# Altium footprint library FOC.PcbLib: 148 footprints (part 3 of 10)
Each footprint in its own frame and in the unit in brackets; x right, y up, seen from the top. Pads: shape width x height; smd on the part's side, far side on the other; paste and mask are expansions set on the pad; w line width, h text height; cw(c..) or ccw(c..) is an arc to the next point about the centre after c.
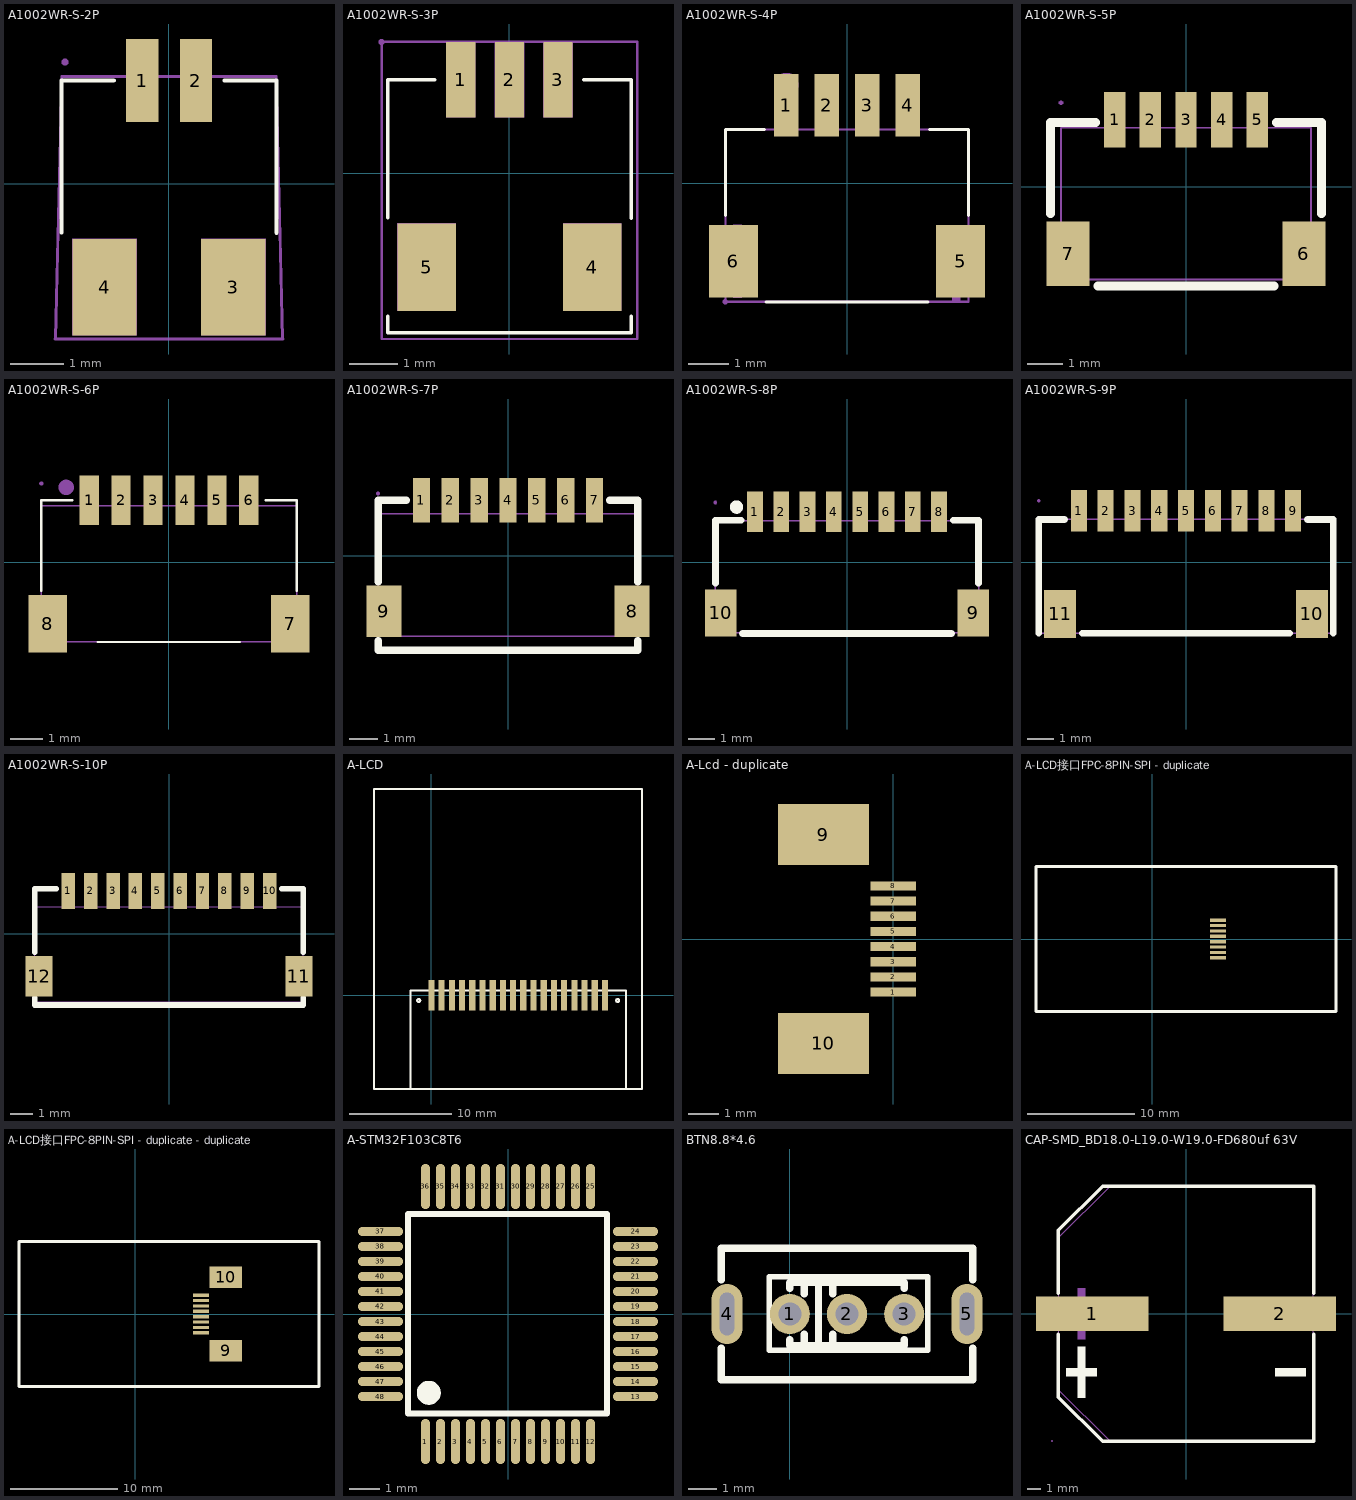
[diagram p2: the footprints below, top view; thin cyan lines are the x and y axes]

## A1002WR-S-2P [mm]
pads (4):
  rect 0.6x1.55 smd: 1(-0.498,1.924) 2(0.501,1.924)
  rect 1.2x1.8 smd: 3(1.201,-1.924) 4(-1.201,-1.924)
Top Overlay:
  lines w0.076: -2,-0.909 -2,1.923 -1.03,1.923 ; 1.033,1.923 2.001,1.923 2.001,-0.913
Mechanical 15:
  region: -1.876,2.267 -1.876,2.292 -1.911,2.327 -1.961,2.327 -1.996,2.292 -1.996,2.267 -1.996,2.243 -1.961,2.207 -1.911,2.207 -1.876,2.243
  region: 0.601,-1.025 1.8,-1.025 1.8,-2.823 0.601,-2.823
  region: -1.801,-1.025 -0.6,-1.025 -0.6,-2.823 -1.801,-2.823
  region: -0.598,2.274 -0.398,2.274 -0.398,1.574 -0.598,1.574
  region: 0.401,2.274 0.601,2.274 0.601,1.574 0.401,1.574
  lines w0.051: -2.127,-2.893 2.128,-2.893 ; -2.115,-2.893 -2,2 2,2 2.116,-2.893
3D body "A1002WR-S-2P.STEP": height 2.44, standoff -0.01, extent -1.75,-2.76 1.75,2.24

## A1002WR-S-3P [mm]
pads (5):
  rect 0.6x1.55 smd: 1(-1.003,1.926) 2(-0.001,1.924) 3(0.997,1.926)
  rect 1.2x1.8 smd: 4(1.701,-1.926) 5(-1.701,-1.926)
Top Overlay:
  lines w0.076: -2.501,-2.94 -2.501,-3.276 2.501,-3.276 2.501,-2.937 ; -2.501,-0.912 -2.501,1.922 -1.534,1.922 ; 1.528,1.922 2.501,1.922 2.501,-0.915
Mechanical 15:
  region: -2.568,2.701 -2.568,2.726 -2.603,2.761 -2.653,2.761 -2.688,2.726 -2.688,2.701 -2.688,2.676 -2.653,2.641 -2.603,2.641 -2.568,2.676
  region: 1.297,1.151 0.697,1.151 0.697,2.701 1.297,2.701
  region: -2.301,-1.027 -1.1,-1.027 -1.1,-2.825 -2.301,-2.825
  region: 1.101,-1.027 2.3,-1.027 2.3,-2.825 1.101,-2.825
  region: 0.299,1.149 -0.301,1.149 -0.301,2.699 0.299,2.699
  region: -0.703,1.151 -1.303,1.151 -1.303,2.701 -0.703,2.701
  lines w0.051: -2.628,-3.403 -2.628,2.701 2.628,2.701 2.628,-3.403 -2.628,-3.403
3D body "3.STEP": height 2.44, standoff -0.01, extent -2.242,-2.5 2.258,2.5

## A1002WR-S-4P [mm]
pads (6):
  rect 0.6x1.55 smd: 1(-1.5,1.924) 2(-0.5,1.924) 3(0.5,1.924) 4(1.5,1.924)
  rect 1.2x1.8 smd: 5(2.8,-1.924) 6(-2.8,-1.924)
Top Overlay:
  lines w0.076: -3,-0.794 -3,1.326 -2.031,1.326 ; -1.992,-2.926 1.993,-2.926 ; 2.031,1.326 2.999,1.326 2.999,-0.794
Mechanical 6:
  circle w0.3: c-1.5,2.424 r0.15
Mechanical 15:
  region: -2.94,-2.924 -2.94,-2.899 -2.976,-2.864 -3.025,-2.864 -3.06,-2.899 -3.06,-2.924 -3.06,-2.948 -3.025,-2.984 -2.976,-2.984 -2.94,-2.948
  region: -2.8,-1.024 -2.6,-1.024 -2.6,-2.824 -2.8,-2.824
  region: 2.6,-1.124 2.8,-1.124 2.8,-2.924 2.6,-2.924
  region: -1.4,1.276 -1.6,1.276 -1.6,2.026 -1.4,2.026
  region: -0.4,1.276 -0.6,1.276 -0.6,2.026 -0.4,2.026
  region: 0.6,1.276 0.4,1.276 0.4,2.026 0.6,2.026
  region: 1.6,1.276 1.4,1.276 1.4,2.026 1.6,2.026
  lines w0.051: -3,-2.924 3,-2.924 3,1.326 -3,1.326 -3,-2.924
3D body "4.STEP": height 3.19, standoff -0.01, extent -3.05,-2.661 3.051,2.559

## A1002WR-S-5P [mm]
pads (7):
  rect 0.6x1.55 smd: 1(-2,1.876) 2(-1,1.876) 3(0,1.876) 4(1,1.876) 5(2,1.876)
  rect 1.2x1.8 smd: 6(3.3,-1.876) 7(-3.3,-1.876)
Top Overlay:
  lines w0.254: -3.8,-0.746 -3.8,0.6 -3.8,1.6 -3.8,1.8 -2.531,1.8 ; -2.468,-2.78 2.469,-2.78 ; 2.531,1.8 3.8,1.8 3.8,0.6 ; 3.8,-0.75 3.8,0.733
Mechanical 15:
  region: 3.2,-1.099 3.4,-1.099 3.4,-2.599 3.2,-2.599
  region: -3.4,-1.099 -3.2,-1.099 -3.2,-2.599 -3.4,-2.599
  region: -1.9,1.401 -2.1,1.401 -2.1,2.351 -1.9,2.351
  region: -0.9,1.401 -1.1,1.401 -1.1,2.351 -0.9,2.351
  region: 0.1,1.401 -0.1,1.401 -0.1,2.351 0.1,2.351
  region: 1.1,1.401 0.9,1.401 0.9,2.351 1.1,2.351
  region: 2.1,1.401 1.9,1.401 1.9,2.351 2.1,2.351
  region: -3.44,2.351 -3.44,2.376 -3.475,2.411 -3.525,2.411 -3.56,2.376 -3.56,2.351 -3.56,2.327 -3.525,2.291 -3.475,2.291 -3.44,2.327
  lines w0.051: -3.5,-2.599 3.5,-2.599 3.5,1.651 -3.5,1.651 -3.5,-2.599
3D body "KHG.STEP": height 3.15, standoff 0.01, extent -3.5,-2.658 3.5,2.542

## A1002WR-S-6P [mm]
pads (8):
  rect 0.6x1.55 smd: 1(-2.5,1.939) 2(-1.5,1.939) 3(-0.498,1.936) 4(0.501,1.937) 5(1.502,1.937) 6(2.502,1.937)
  rect 1.2x1.8 smd: 7(3.801,-1.939) 8(-3.801,-1.937)
Top Overlay:
  lines w0.076: -3.998,-0.899 -3.998,1.935 -3.032,1.935 ; -2.238,-2.507 2.222,-2.507 ; 3.033,1.935 4.003,1.935 4.003,-0.902
Mechanical 6:
  circle w0.24: c-3.22,2.34 r0.12
Mechanical 15:
  region: 2.602,1.66 2.402,1.66 2.402,2.46 2.602,2.46
  region: 1.602,1.66 1.402,1.66 1.402,2.46 1.602,2.46
  region: 0.601,1.66 0.401,1.66 0.401,2.46 0.601,2.46
  region: -0.398,1.66 -0.598,1.66 -0.598,2.46 -0.398,2.46
  region: -1.4,1.66 -1.6,1.66 -1.6,2.46 -1.4,2.46
  region: -2.4,1.66 -2.6,1.66 -2.6,2.46 -2.4,2.46
  region: 3.701,-1.439 3.901,-1.439 3.901,-2.439 3.701,-2.439
  region: -3.901,-1.437 -3.701,-1.437 -3.701,-2.437 -3.901,-2.437
  region: -3.94,2.46 -3.94,2.485 -3.975,2.52 -4.025,2.52 -4.06,2.485 -4.06,2.46 -4.06,2.435 -4.025,2.4 -3.975,2.4 -3.94,2.435
  lines w0.051: -4,-2.5 -4,1.76 4,1.76 4,-2.5 -4,-2.5
3D body "6.STEP": height 2.44, standoff -0.01, extent -3.79,-2.76 3.71,2.24

## A1002WR-S-7P [mm]
pads (9):
  rect 0.6x1.55 smd: 1(-2.999,1.924) 2(-1.999,1.924) 3(-0.997,1.921) 4(0,1.924) 5(0.998,1.925) 6(2.001,1.924) 7(3,1.924)
  rect 1.2x1.8 smd: 8(4.3,-1.925) 9(-4.3,-1.925)
Top Overlay:
  lines w0.254: -4.5,-2.939 -4.5,-3.275 4.5,-3.275 4.5,-2.936 ; -4.5,-0.912 -4.5,1.923 -3.531,1.923 ; 3.531,1.923 4.5,1.923 4.5,-0.914
Mechanical 15:
  region: -4.44,2.162 -4.44,2.187 -4.475,2.222 -4.525,2.222 -4.56,2.187 -4.56,2.162 -4.56,2.137 -4.525,2.102 -4.475,2.102 -4.44,2.137
  region: 3.1,1.262 2.9,1.262 2.9,2.162 3.1,2.162
  region: 2.101,1.262 1.901,1.262 1.901,2.162 2.101,2.162
  region: 1.098,1.262 0.898,1.262 0.898,2.162 1.098,2.162
  region: 0.1,1.262 -0.1,1.262 -0.1,2.162 0.1,2.162
  region: -0.897,1.262 -1.097,1.262 -1.097,2.162 -0.897,2.162
  region: -1.899,1.262 -2.099,1.262 -2.099,2.162 -1.899,2.162
  region: -2.899,1.262 -3.099,1.262 -3.099,2.162 -2.899,2.162
  region: -4.5,-1.388 -4.1,-1.388 -4.1,-2.788 -4.5,-2.788
  region: 4.1,-1.388 4.5,-1.388 4.5,-2.788 4.1,-2.788
  lines w0.051: -4.5,-2.788 -4.5,1.462 4.5,1.462 4.5,-2.788 -4.5,-2.788
3D body "7.STEP": height 2.44, standoff -0.01, extent -4.237,-2.595 4.263,2.405

## A1002WR-S-8P [mm]
pads (10):
  rect 0.6x1.55 smd: 1(-3.5,1.924) 2(-2.5,1.924) 3(-1.5,1.922) 4(-0.5,1.924) 5(0.5,1.924) 6(1.5,1.924) 7(2.5,1.924) 8(3.5,1.924)
  rect 1.2x1.8 smd: 9(4.8,-1.924) 10(-4.8,-1.924)
Top Overlay:
  circle w0.254: c-4.2,2.1 r0.127
  lines w0.254: -5,-0.794 -5,1.6 -4.031,1.6 ; -3.968,-2.7 3.969,-2.7 ; 4.032,1.6 5,1.6 5,1.5 5,-0.794
Mechanical 6:
  circle w0.254: c-3.5,1.7 r0.127
Mechanical 15:
  region: -4.95,-1.174 -4.65,-1.174 -4.65,-2.674 -4.95,-2.674
  region: 4.65,-1.174 4.95,-1.174 4.95,-2.674 4.65,-2.674
  region: -3.4,1.476 -3.6,1.476 -3.6,2.276 -3.4,2.276
  region: -2.4,1.476 -2.6,1.476 -2.6,2.276 -2.4,2.276
  region: -1.4,1.476 -1.6,1.476 -1.6,2.276 -1.4,2.276
  region: -0.4,1.476 -0.6,1.476 -0.6,2.276 -0.4,2.276
  region: 0.6,1.476 0.4,1.476 0.4,2.276 0.6,2.276
  region: 1.6,1.476 1.4,1.476 1.4,2.276 1.6,2.276
  region: 2.6,1.476 2.4,1.476 2.4,2.276 2.6,2.276
  region: 3.6,1.476 3.4,1.476 3.4,2.276 3.6,2.276
  region: -4.94,2.276 -4.94,2.3 -4.975,2.336 -5.025,2.336 -5.06,2.3 -5.06,2.276 -5.06,2.251 -5.025,2.216 -4.975,2.216 -4.94,2.251
  lines w0.051: -5,-2.674 5,-2.674 5,1.576 -5,1.576 -5,-2.674
3D body "ss.STEP": height 2.44, standoff -0.01, extent -4.743,-2.567 4.757,2.433

## A1002WR-S-9P [mm]
pads (11):
  rect 0.6x1.55 smd: 1(-4,1.924) 2(-3,1.924) 3(-1.997,1.922) 4(-0.999,1.924) 5(0,1.924) 6(1.001,1.924) 7(2,1.924) 8(3,1.924) 9(4,1.924)
  rect 1.2x1.8 smd: 10(4.7,-1.924) 11(-4.7,-1.924)
Top Overlay:
  lines w0.254: -5.5,-2.65 -5.5,1.6 -4.531,1.6 ; -3.868,-2.65 3.869,-2.65 ; 4.531,1.6 5.5,1.6 5.5,-2.65
Mechanical 15:
  region: -5.44,2.299 -5.44,2.324 -5.475,2.359 -5.525,2.359 -5.56,2.324 -5.56,2.299 -5.56,2.275 -5.525,2.239 -5.475,2.239 -5.44,2.275
  region: 4.1,1.549 3.9,1.549 3.9,2.299 4.1,2.299
  region: 3.1,1.549 2.9,1.549 2.9,2.299 3.1,2.299
  region: 2.1,1.549 1.9,1.549 1.9,2.299 2.1,2.299
  region: 1.101,1.549 0.901,1.549 0.901,2.299 1.101,2.299
  region: 0.1,1.549 -0.1,1.549 -0.1,2.299 0.1,2.299
  region: -0.899,1.549 -1.099,1.549 -1.099,2.299 -0.899,2.299
  region: -1.897,1.547 -2.097,1.547 -2.097,2.297 -1.897,2.297
  region: -2.9,1.549 -3.1,1.549 -3.1,2.299 -2.9,2.299
  region: -3.9,1.549 -4.1,1.549 -4.1,2.299 -3.9,2.299
  region: 4.677,-1.224 4.977,-1.224 4.977,-2.624 4.677,-2.624
  region: -4.977,-1.224 -4.677,-1.224 -4.677,-2.624 -4.977,-2.624
  lines w0.051: -5.5,-2.649 -5.5,1.601 5.5,1.601 5.5,-2.649 -5.5,-2.649
3D body "9.STEP": height 2.44, standoff -0.01, extent -5.268,-2.628 5.232,2.372

## A1002WR-S-10P [mm]
pads (12):
  rect 0.6x1.6 smd: 1(-4.503,1.905) 2(-3.503,1.905) 3(-2.5,1.905) 4(-1.503,1.905) 5(-0.503,1.905) 6(0.497,1.905) 7(1.497,1.905) 8(2.497,1.905) 9(3.497,1.905) 10(4.499,1.905)
  rect 1.2x1.8 smd: 11(5.801,-1.905) 12(-5.801,-1.905)
Top Overlay:
  lines w0.254: -6.001,-2.859 -6.001,-3.195 6.001,-3.195 6.001,-2.856 ; -6.001,-0.831 -6.001,2.003 -5.034,2.003 ; 5.03,2.003 6.001,2.003 6.001,-0.834
Mechanical 15:
  region: -5.94,1.904 -5.94,1.929 -5.975,1.964 -6.025,1.964 -6.06,1.929 -6.06,1.904 -6.06,1.88 -6.025,1.844 -5.975,1.844 -5.94,1.88
  region: 4.599,1.154 4.399,1.154 4.399,1.904 4.599,1.904
  region: 3.597,1.154 3.397,1.154 3.397,1.904 3.597,1.904
  region: 2.597,1.154 2.397,1.154 2.397,1.904 2.597,1.904
  region: 1.597,1.154 1.397,1.154 1.397,1.904 1.597,1.904
  region: 0.597,1.154 0.397,1.154 0.397,1.904 0.597,1.904
  region: -0.403,1.154 -0.603,1.154 -0.603,1.904 -0.403,1.904
  region: -1.403,1.154 -1.603,1.154 -1.603,1.904 -1.403,1.904
  region: -2.4,1.154 -2.6,1.154 -2.6,1.904 -2.4,1.904
  region: -3.403,1.154 -3.603,1.154 -3.603,1.904 -3.403,1.904
  region: -4.403,1.154 -4.603,1.154 -4.603,1.904 -4.403,1.904
  region: -5.926,-1.255 -5.676,-1.255 -5.676,-2.555 -5.926,-2.555
  region: 5.676,-1.255 5.926,-1.255 5.926,-2.555 5.676,-2.555
  lines w0.051: -6,-3.046 -6,1.204 6,1.204 6,-3.046 -6,-3.046
3D body "asd.STEP": height 2.44, standoff -0.01, extent -5.729,-2.667 5.771,2.333

## A-LCD [mm] "ST7789(26.16*29.22),"
pads (18):
  rect 0.6x3 smd: 1(0,0) 2(1,0) 3(2,0) 4(3,0) 5(4,0) 6(5,0) 7(6,0) 8(7,0) 9(8,0) 10(9,0) 11(10,0) 12(11,0) 13(12,0) 14(13,0) 15(14,0) 16(15,0) 17(16,0) 18(17,0)
Top Overlay:
  circle w0.2: c-1.25,-0.502 r0.15
  circle w0.2: c18.25,-0.502 r0.15
  lines w0.2: -2.05,-9.172 -2.05,0.498 19.05,0.498 19.05,-9.172 ; -5.65,-9.172 20.65,-9.172 20.65,20.228 -5.65,20.228 -5.65,-9.172
3D body: height 2.1, standoff 0, extent -5.675,-9.175 20.675,20.2
3D body: height 1.8, standoff 0, extent -4.5,-5.05 19.5,18.95

## A-Lcd - duplicate [mm]
pads (10):
  rect 1.5x0.3 smd: 1(0,-1.75) 2(0,-1.25) 3(0,-0.75) 4(0,-0.25) 5(0,0.25) 6(0,0.75) 7(0,1.25) 8(0,1.75)
  rect 3x2 smd: 9(-2.314,3.443) 10(-2.314,-3.443)

## A-LCD接口FPC-8PIN-SPI - duplicate [mm]
pads (8):
  rect 1.5x0.3 smd: 1(6.096,1.75) 2(6.096,1.25) 3(6.096,0.75) 4(6.096,0.25) 5(6.096,-0.25) 6(6.096,-0.75) 7(6.096,-1.25) 8(6.096,-1.75)
Top Overlay:
  lines w0.254: -10.845,6.75 -10.845,-6.75 17.105,-6.75 17.105,6.75 -10.845,6.75 ; -10.845,6.75 -10.845,6.75
3D body "屏幕LCD-0.96inch.STEP": height 1.6, standoff 0.1, extent -10.927,-6.75 17.023,6.75

## A-LCD接口FPC-8PIN-SPI - duplicate - duplicate [mm]
pads (10):
  rect 1.5x0.3 smd: 1(6.096,1.75) 2(6.096,1.25) 3(6.096,0.75) 4(6.096,0.25) 5(6.096,-0.25) 6(6.096,-0.75) 7(6.096,-1.25) 8(6.096,-1.75)
  rect 3x2 smd: 9(8.41,-3.443) 10(8.41,3.443)
Top Overlay:
  lines w0.254: -10.845,6.75 17.105,6.75 17.105,-6.75 -10.845,-6.75 -10.845,6.75 ; -10.845,6.75 -10.845,6.75
3D body "屏幕LCD-0.96inch.STEP": height 1.6, standoff 0.1, extent -10.927,-6.75 17.023,6.75

## A-STM32F103C8T6 [mm]
pads (48):
  oval 0.3x1.5 smd: 1(-2.75,-4.25) 2(-2.25,-4.25) 3(-1.75,-4.25) 4(-1.25,-4.25) 5(-0.75,-4.25) 6(-0.25,-4.25) 7(0.25,-4.25) 8(0.75,-4.25) 9(1.25,-4.25) 10(1.75,-4.25) 11(2.25,-4.25) 12(2.75,-4.25) 25(2.75,4.25) 26(2.25,4.25) 27(1.75,4.25) 28(1.25,4.25) 29(0.75,4.25) 30(0.25,4.25) 31(-0.25,4.25) 32(-0.75,4.25) 33(-1.25,4.25) 34(-1.75,4.25) 35(-2.25,4.25) 36(-2.75,4.25)
  oval 1.5x0.3 smd: 13(4.25,-2.75) 14(4.25,-2.25) 15(4.25,-1.75) 16(4.25,-1.25) 17(4.25,-0.75) 18(4.25,-0.25) 19(4.25,0.25) 20(4.25,0.75) 21(4.25,1.25) 22(4.25,1.75) 23(4.25,2.25) 24(4.25,2.75) 37(-4.25,2.75) 38(-4.25,2.25) 39(-4.25,1.75) 40(-4.25,1.25) 41(-4.25,0.75) 42(-4.25,0.25) 43(-4.25,-0.25) 44(-4.25,-0.75) 45(-4.25,-1.25) 46(-4.25,-1.75) 47(-4.25,-2.25) 48(-4.25,-2.75)
Top Overlay:
  lines w0.2: -2.896,3.34 3.302,3.34 3.302,-3.315 -3.327,-3.315 -3.327,3.34 -2.565,3.34
  lines w0.4: -2.642,-2.426 ccw(c-2.64,-2.626) -2.639,-2.426
3D body: height 0.25, standoff 0, extent -4.064,-4.064 4.064,4.064

## BTN8.8*4.6 [mm]
pads (5):
  round 1.4 hole 0.8: 1(0,0) 2(2,0) 3(4,0)
  oval 1.1x2.1 hole 0.5 slot 1.5 at 90 deg: 4(-2.2,0) 5(6.2,0)
Top Overlay:
  lines w0.2: -0.725,-1.275 -0.725,1.3 4.825,1.3 4.825,-1.275 -0.725,-1.275
  lines w0.254: -2.4,-1.2 -2.4,-2.302 6.4,-2.302 6.4,-1.2 ; -2.4,1.2 -2.4,2.298 6.4,2.298 6.4,1.2 ; 0,-0.902 0,-1.102 4,-1.102 4,-0.902 ; 0,0.898 0,1.098 4,1.098 4,0.898 ; 0.5,-1.102 0.5,-0.702 ; 0.5,0.698 0.5,1.098 ; 1,-1.102 1,1.098 ; 1.5,-1.102 1.5,-0.702 ; 1.5,0.698 1.5,1.098
3D body: height 4, standoff 0, extent -2.4,-2.3 6.4,2.275
3D body: height 3.5, standoff 0, extent -0.725,-1.55 4.825,1.5
3D body: height 6.5, standoff 0, extent 0.488,-0.813 2.363,0.763

## CAP-SMD_BD18.0-L19.0-W19.0-FD680uf 63V [mm]
pads (2):
  rect 8.4x2.6 smd mask+0.051: 1(-7,0) 2(7,0)
Top Overlay:
  region: -8.075,-2.47 -8.075,-6.27 -7.505,-6.27 -7.505,-2.47
  region: -8.93,-4.085 -8.93,-4.655 -6.65,-4.655 -6.65,-4.085
  region: 8.93,-4.085 8.93,-4.655 6.65,-4.655 6.65,-4.085
  lines w0.254: -9.525,-1.531 -9.525,-6.223 -6.223,-9.525 9.525,-9.525 9.525,-1.531 ; -9.525,1.531 -9.525,6.223 -6.223,9.525 9.525,9.525 9.525,1.531
Mechanical 6:
  region: -8.075,1.9 -8.075,-1.9 -7.505,-1.9 -7.505,1.9
  region: -8.93,0.285 -8.93,-0.285 -6.65,-0.285 -6.65,0.285
  region: 8.93,0.285 8.93,-0.285 6.65,-0.285 6.65,0.285
Mechanical 15:
  region: -10,0.625 -10,-0.625 -3.2,-0.625 -3.2,0.625
  region: 10,0.625 10,-0.625 3.2,-0.625 3.2,0.625
  region: -9.94,-9.5 -9.94,-9.475 -9.975,-9.44 -10.025,-9.44 -10.06,-9.475 -10.06,-9.5 -10.06,-9.525 -10.025,-9.56 -9.975,-9.56 -9.94,-9.525
  lines w0.051: -9.5,-5.7 -9.5,5.7 -5.7,9.5 9.5,9.5 9.5,-9.5 -5.7,-9.5 -9.5,-5.7